# Altium footprint library General.PcbLib: 446 footprints (part 15 of 28)
Each footprint in its own frame and in the unit in brackets; x right, y up, seen from the top. Pads: shape width x height; smd on the part's side, far side on the other; paste and mask are expansions set on the pad; w line width, h text height; cw(c..) or ccw(c..) is an arc to the next point about the centre after c.
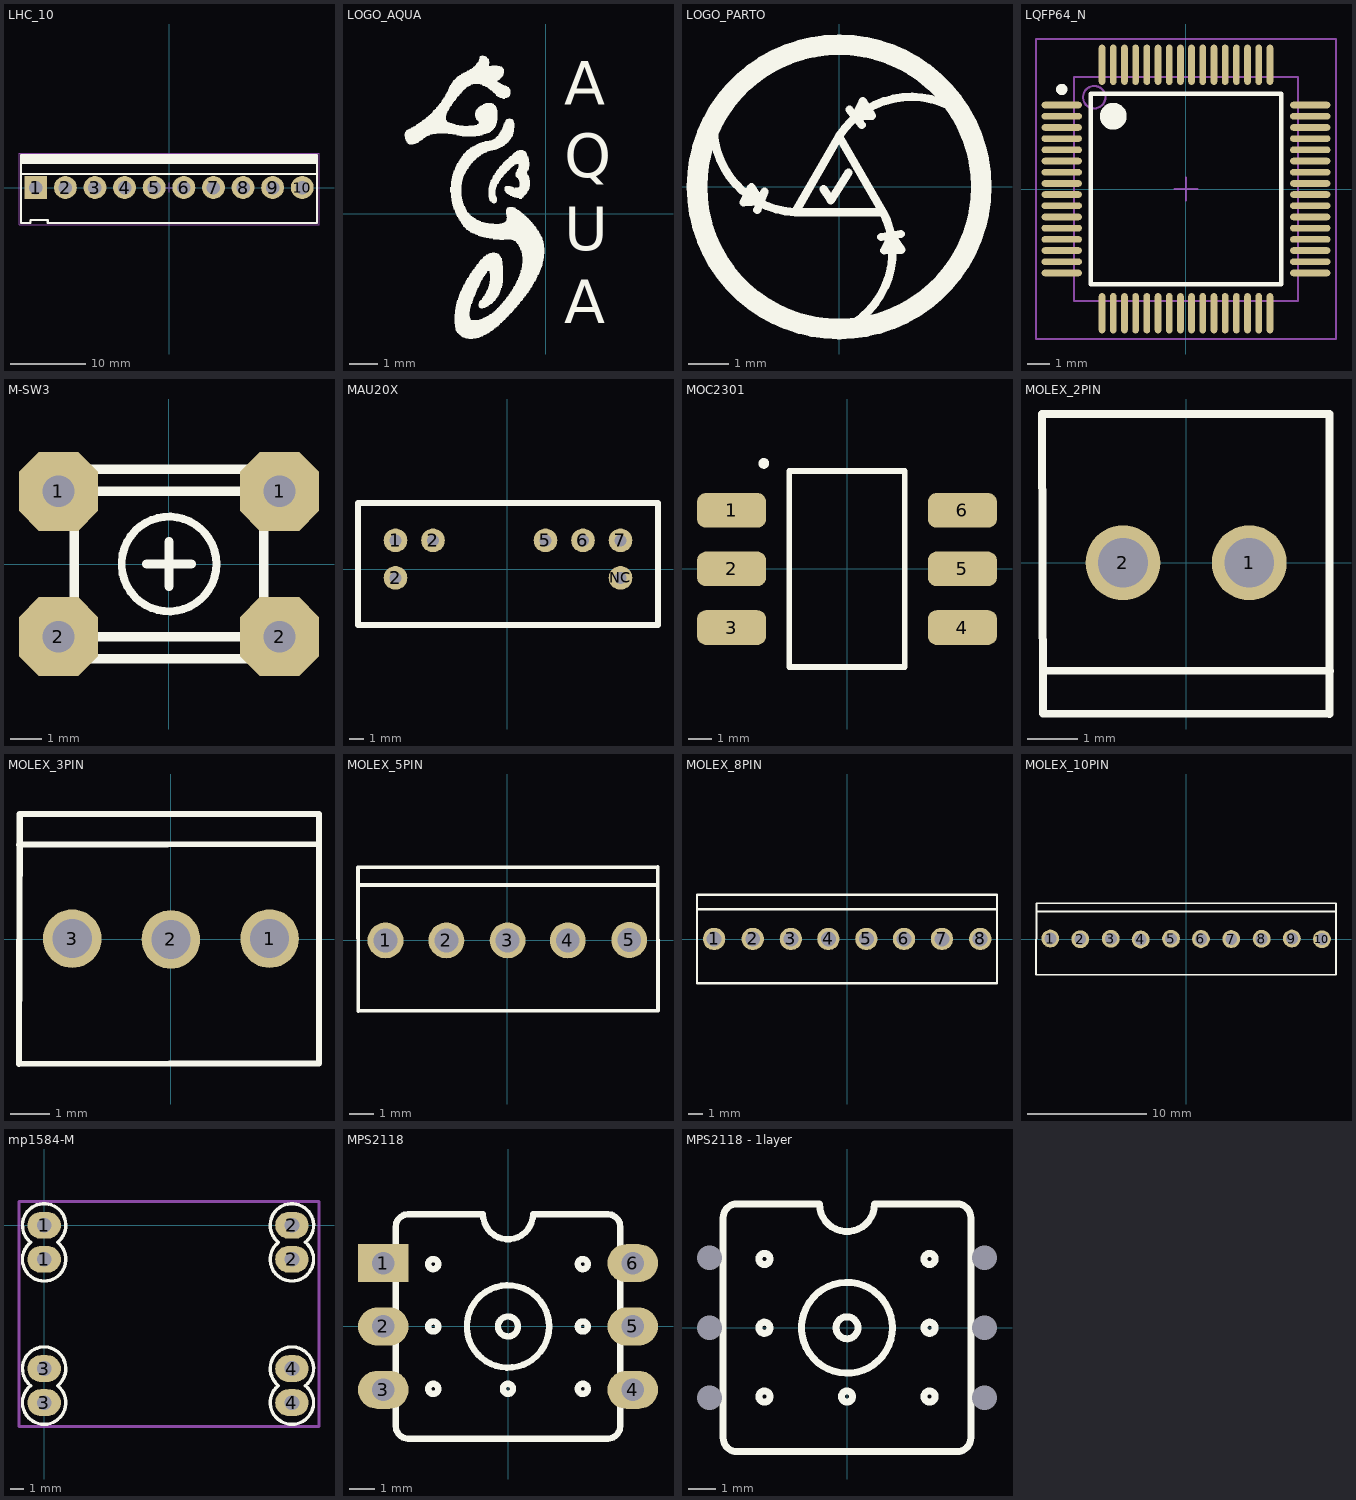
[diagram p14: the footprints below, top view; thin cyan lines are the x and y axes]

## LHC_10 [mil] "Connector; Power; 10 Position,3.96mm Pitch"
height 370.08
pads (10):
  rect 120x120 hole 70.87: 1(-697.5,0)
  round 120 hole 70.87: 2(-542.5,0) 3(-387.5,0) 4(-232.5,0) 5(-77.5,0) 6(77.5,0) 7(232.5,0) 8(387.5,0) 9(542.5,0) 10(697.5,0)
Top Overlay:
  rectangle: -775,129.92 775,169.29
  lines w12: -775,70.96 0,70.96 ; -775,71 775,71 ; 775,129.92 -775,129.92 ; -775,129.92 -775,-185.04 -725,-185.04 -725,-170 -635,-170 -635,-185.04 775,-185.04 775,169.29 -775,169.29 -775,129.92
Mechanical 13:
  lines w3.94: -775,70.96 0,70.96 ; -775,71 775,71 ; 775,129.92 -775,129.92 ; -775,129.92 -775,169.29 775,169.29 775,-185.04 -635,-185.04 -635,-170 -725,-170 -725,-185.04 -775,-185.04 -775,129.92 ; -725.06,-27.56 -669.94,-27.56 -669.94,27.56 -725.06,27.56 -725.06,-27.56 ; -570.06,-27.56 -570.06,27.56 -514.94,27.56 -514.94,-27.56 -570.06,-27.56 ; -415.06,-27.56 -359.94,-27.56 -359.94,27.56 -415.06,27.56 -415.06,-27.56 ; -260.06,-27.56 -260.06,27.56 -204.94,27.56 -204.94,-27.56 -260.06,-27.56 ; -105.06,-27.56 -49.94,-27.56 -49.94,27.56 -105.06,27.56 -105.06,-27.56 ; 49.94,-27.56 105.06,-27.56 105.06,27.56 49.94,27.56 49.94,-27.56 ; 204.94,-27.56 204.94,27.56 260.06,27.56 260.06,-27.56 204.94,-27.56 ; 359.94,-27.56 415.06,-27.56 415.06,27.56 359.94,27.56 359.94,-27.56 ; 514.94,-27.56 514.94,27.56 570.06,27.56 570.06,-27.56 514.94,-27.56 ; 669.94,-27.56 725.06,-27.56 725.06,27.56 669.94,27.56 669.94,-27.56
Mechanical 15:
  lines w3.94: -25,0 0,0 ; 0,-25 0,0 ; 0,25 0,0 ; 25,0 0,0 ; -785,-195 -785,180 785,180 785,-195 -785,-195
3D body: height 129.92, standoff 0, extent -774.98,-185.02 774.98,70.98
3D body: height 370.08, standoff 0, extent -774.98,71.02 774.98,129.9
3D body: height 370.08, standoff 330.71, extent -774.98,129.94 774.98,169.27
3D body: height 429.92, standoff -145.67, extent -725.04,-27.54 -669.96,27.54
3D body: height 429.92, standoff -145.67, extent -570.04,-27.54 -514.96,27.54
3D body: height 429.92, standoff -145.67, extent -415.04,-27.54 -359.96,27.54
3D body: height 429.92, standoff -145.67, extent -260.04,-27.54 -204.96,27.54
3D body: height 429.92, standoff -145.67, extent -105.04,-27.54 -49.96,27.54
3D body: height 429.92, standoff -145.67, extent 49.96,-27.54 105.04,27.54
3D body: height 429.92, standoff -145.67, extent 204.96,-27.54 260.04,27.54
3D body: height 429.92, standoff -145.67, extent 359.96,-27.54 415.04,27.54
3D body: height 429.92, standoff -145.67, extent 514.96,-27.54 570.04,27.54
3D body: height 429.92, standoff -145.67, extent 669.96,-27.54 725.04,27.54

## LOGO_AQUA [mm]
Top Overlay:
  drawing of 3 lines, arcs and shapes, not listed
  text "A" at 0.635,3.81 h1.52
  text "Q" at 0.635,1.27 h1.52
  text "U" at 0.635,-1.27 h1.52
  text "A" at 0.635,-3.81 h1.52

## LOGO_PARTO [mm]
Top Overlay:
  circle w0.508: c0,0 r3.5
  lines w0.203: -3.088,1.59 ccw(c-0.978,1.485) -1.083,-0.625 ; -2.013,-0.568 -1.836,-0.113 ; -0.387,-0.055 -0.203,-0.33 0.229,0.356 ; 0.167,-3.469 ccw(c-0.797,-1.59) 1.083,-0.625 ; 0.254,1.905 0.559,1.524 ; 1.038,-1.233 1.52,-1.16 ; 2.921,1.88 ccw(c1.775,0.104) 0,1.25 ; -1.083,-0.625 1.083,-0.625 ; -1.083,-0.625 0,1.25 ; 0,1.25 1.083,-0.625 ; -2.354,-0.383 -1.93,-0.356 -2.161,-0.008 -2.354,-0.383 ; 0.396,1.727 0.813,1.753 0.584,2.108 0.396,1.727 ; 1.109,-1.567 1.531,-1.547 1.295,-1.194 1.109,-1.567

## LQFP64_N [mm] "for stm32f103"
pads (64):
  oval 1.8x0.3 smd: 1(-5.55,3.75) 2(-5.55,3.25) 3(-5.55,2.75) 4(-5.55,2.25) 5(-5.55,1.75) 6(-5.55,1.25) 7(-5.55,0.75) 8(-5.55,0.25) 9(-5.55,-0.25) 10(-5.55,-0.75) 11(-5.55,-1.25) 12(-5.55,-1.75) 13(-5.55,-2.25) 14(-5.55,-2.75) 15(-5.55,-3.25) 16(-5.55,-3.75) 33(5.55,-3.75) 34(5.55,-3.25) 35(5.55,-2.75) 36(5.55,-2.25) 37(5.55,-1.75) 38(5.55,-1.25) 39(5.55,-0.75) 40(5.55,-0.25) 41(5.55,0.25) 42(5.55,0.75) 43(5.55,1.25) 44(5.55,1.75) 45(5.55,2.25) 46(5.55,2.75) 47(5.55,3.25) 48(5.55,3.75)
  oval 0.3x1.8 smd: 17(-3.75,-5.55) 18(-3.25,-5.55) 19(-2.75,-5.55) 20(-2.25,-5.55) 21(-1.75,-5.55) 22(-1.25,-5.55) 23(-0.75,-5.55) 24(-0.25,-5.55) 25(0.25,-5.55) 26(0.75,-5.55) 27(1.25,-5.55) 28(1.75,-5.55) 29(2.25,-5.55) 30(2.75,-5.55) 31(3.25,-5.55) 32(3.75,-5.55) 49(3.75,5.55) 50(3.25,5.55) 51(2.75,5.55) 52(2.25,5.55) 53(1.75,5.55) 54(1.25,5.55) 55(0.75,5.55) 56(0.25,5.55) 57(-0.25,5.55) 58(-0.75,5.55) 59(-1.25,5.55) 60(-1.75,5.55) 61(-2.25,5.55) 62(-2.75,5.55) 63(-3.25,5.55) 64(-3.75,5.55)
Top Overlay:
  circle w0.25: c-5.55,4.45 r0.125
  circle w0.6: c-3.25,3.25 r0.3
  lines w0.2: -4.25,-4.25 -4.25,4.25 4.25,4.25 4.25,-4.25 -4.25,-4.25
Mechanical 13:
  circle w0.1: c-4.1,4.1 r0.5
  lines w0.1: -5,-5 -5,5 5,5 5,-5 -5,-5
Mechanical 15:
  lines w0.1: -0.5,0 0.5,0 ; 0,-0.5 0,0.5 ; -6.7,-6.7 -6.7,6.7 6.7,6.7 6.7,-6.7 -6.7,-6.7
3D body "STM32F107 -LQFP64 10mm x 10mm.step": height 1.6, standoff 0.01, extent -6.003,-5.994 5.994,6.003

## M-SW3 [mm]
pads (4):
  oct 2.5x2.5 hole 1 unplated: 1(-3.5,2.3) 1(3.5,2.3) 2(-3.5,-2.3) 2(3.5,-2.3)
Top Overlay:
  circle w0.25: c0,0 r1.5
  lines w0.3: -3.525,-2.3 3.5,-2.3 ; -3.525,2.3 3.5,2.3 ; -0.7,0 0.7,0 ; 0,-0.7 0,0.7 ; -3,-3 3,-3 3,3 -3,3 -3,-3
3D body "User Library-KFC-A06-HA-4_3.STEP": height 4.3, standoff 0, extent -4.424,-2.946 4.576,3.054

## MAU20X [mm]
pads (7):
  round 1.6 hole 0.8: 1(-7.57,1.959) 2(-7.57,-0.581) 2(-5.03,1.959) 5(2.59,1.959) 6(5.13,1.959) 7(7.67,1.959) NC(7.67,-0.581)
Top Overlay:
  lines w0.4: -10.11,-3.781 10.21,-3.781 10.21,4.499 -10.11,4.499 -10.11,-3.781
3D body "User Library-TMV0505EN.STEP": height 10.2, standoff -3.2, extent -9.852,-3.659 9.648,3.891

## MAU20X/A0505D [mm]

## MOC2301 [mm]
pads (6):
  rrect50% 3x1.5 smd: 1(-5,2.54) 2(-5,0) 3(-5,-2.54) 4(5,-2.54) 5(5,0) 6(5,2.54)
Top Overlay:
  circle w0.254: c-3.607,4.572 r0.105
  lines w0.254: -2.501,-4.25 2.401,-4.25 ; -2.501,4.25 2.401,4.25 ; -2.5,-4.25 -2.5,4.25 ; 2.5,-4.25 2.5,4.25
3D body "moc3051.step": height 5.93, standoff 0, extent -4.925,-4.445 4.975,4.445

## MOLEX_2PIN [mm]
pads (2):
  round 1.5 hole 1: 1(1.265,0) 2(-1.265,0)
Top Overlay:
  lines w0.16: -2.86,-2.16 2.88,-2.17 ; -2.885,2.98 -2.865,-3.02 2.875,-3.03 2.875,2.98 -2.885,2.98
3D body "User Library-Molex 2 pines.STEP": height 3.2, standoff -11.5, extent -2.875,-3.02 2.875,2.98

## MOLEX_3PIN [mm]
pads (3):
  round 1.5 hole 1: 1(2.525,0.01) 2(0,-0.01) 3(-2.525,0.01)
Top Overlay:
  lines w0.16: -3.88,2.41 3.76,2.43 ; -3.887,-3.198 3.79,-3.178 3.79,3.2 -3.867,3.2 -3.887,-3.198
3D body "SW3dPS-Molex - 3-Pin Header with Lock (0.100in pitch).STEP": height 10.69, standoff -3.53, extent -3.835,-3.15 3.785,3.2

## MOLEX_5PIN [mm]
pads (5):
  round 1.5 hole 1: 1(-5.09,-0.01) 2(-2.55,-0.01) 3(0.01,-0.01) 4(2.52,-0.01) 5(5.09,0.01)
Top Overlay:
  lines w0.16: -6.159,2.31 6.27,2.31 ; -6.24,3.04 -6.23,-2.96 6.29,-2.95 6.28,3.06 -6.24,3.04
3D body "User Library-Molex 5 pines.STEP": height 11.5, standoff -3.2, extent -6.24,-2.95 6.28,3.05

## MOLEX_8PIN [mm]
pads (8):
  round 1.5 hole 1: 1(-8.94,0.025) 2(-6.34,0.025) 3(-3.78,0.025) 4(-1.26,0.025) 5(1.29,0.025) 6(3.82,0.025) 7(6.37,0.025) 8(8.94,0.025)
Top Overlay:
  lines w0.16: -10.09,2.03 10.07,2.03 ; -10.09,-2.96 -10.09,3 10.07,3 10.07,-2.96 -10.09,-2.96
3D body "User Library-Molex 8 pines.STEP": height 11.5, standoff -3.2, extent -10.04,-2.995 10.08,3.005

## MOLEX_10PIN [mm]
pads (10):
  round 1.5 hole 1: 1(-11.425,0.035) 2(-8.905,-0.015) 3(-6.335,0.025) 4(-3.825,-0.035) 5(-1.265,0.025) 6(1.245,0.005) 7(3.795,-0.005) 8(6.355,0.015) 9(8.895,0.035) 10(11.425,-0.015)
Top Overlay:
  lines w0.16: -12.55,2.3 12.59,2.3 ; -12.63,-3.01 -12.6,3.01 12.6,3 12.61,-3.01 -12.63,-3.01
3D body "User Library-Molex 10 pines.STEP": height 11.5, standoff -3.2, extent -12.615,-3.005 12.605,2.995

## mp1584-M [mm] "module"
pads (8):
  oval 2.5x2 hole 1.1: 1(0,-2.54) 1(0,0) 2(18.5,-2.54) 2(18.5,0) 3(0,-13.24) 3(0,-10.7) 4(18.5,-13.24) 4(18.5,-10.7)
Top Overlay:
  lines w0.254: -1.017,-11.982 ccw(c0,-13.24) 1.008,-11.974 ; -1.017,-1.282 ccw(c0,-2.54) 1.008,-1.274 ; -1.006,-11.967 cw(c0,-10.7) 1.004,-11.969 ; -1.006,-1.267 cw(c0,0) 1.004,-1.269 ; 17.483,-11.982 ccw(c18.5,-13.24) 19.508,-11.974 ; 17.483,-1.282 ccw(c18.5,-2.54) 19.508,-1.274 ; 17.494,-11.967 cw(c18.5,-10.7) 19.504,-11.969 ; 17.494,-1.267 cw(c18.5,0) 19.504,-1.269
Mechanical 15:
  lines w0.254: -1.877,-15.022 -1.877,1.778 20.523,1.778 20.523,-15.022 -1.877,-15.022

## MPS2118 [mm] "presser Sensor"
pads (6):
  rect 2.032x1.524 hole 0.9: 1(-5,2.54)
  oval 2.032x1.524 hole 0.9: 2(-5,0) 3(-5,-2.54) 4(5,-2.54) 5(5,0) 6(5,2.54)
Top Overlay:
  circle w0.254: c3,2.5 r0.202
  circle w0.254: c-3,2.5 r0.202
  circle w0.254: c-3,-2.5 r0.202
  circle w0.254: c-3,0 r0.202
  circle w0.254: c0,-2.5 r0.202
  circle w0.254: c3,-2.5 r0.202
  circle w0.254: c3,0 r0.202
  circle w0.254: c0,0 r0.4
  circle w0.254: c0,0 r1.65
  lines w0.254: -4.5,-4 ccw(c-4,-4) -4,-4.5 4,-4.5 ccw(c4,-4) 4.5,-4 4.5,4 ccw(c4,4) 4,4.5 1,4.5 cw(c0,4.5) -1,4.5 -4,4.5 ccw(c-4,4) -4.5,4 -4.5,-4
3D body: height 3.13, standoff 0.03, extent -4.5,-4.5 4.5,4.5
3D body: height 9.13, standoff 3.13, extent -1.65,-1.65 1.65,1.65

## MPS2118 - 1layer [mm] "presser Sensor"
pads (6):
  round 0 / inner oval 2.032x1.524 / far side rect 2.032x1.524 hole 0.9 unplated: 1(-5,2.54)
  round 0 / inner oval 2.032x1.524 / far side oval 2.032x1.524 hole 0.9 unplated: 2(-5,0) 3(-5,-2.54) 4(5,-2.54) 5(5,0) 6(5,2.54)
Top Overlay:
  circle w0.254: c0,0 r1.65
  circle w0.254: c0,0 r0.4
  circle w0.254: c3,0 r0.202
  circle w0.254: c3,-2.5 r0.202
  circle w0.254: c0,-2.5 r0.202
  circle w0.254: c-3,0 r0.202
  circle w0.254: c-3,-2.5 r0.202
  circle w0.254: c-3,2.5 r0.202
  circle w0.254: c3,2.5 r0.202
  lines w0.254: -4.5,-4 ccw(c-4,-4) -4,-4.5 4,-4.5 ccw(c4,-4) 4.5,-4 4.5,4 ccw(c4,4) 4,4.5 1,4.5 cw(c0,4.5) -1,4.5 -4,4.5 ccw(c-4,4) -4.5,4 -4.5,-4
3D body: height 9.13, standoff 3.13, extent -1.65,-1.65 1.65,1.65
3D body: height 3.13, standoff 0.03, extent -4.5,-4.5 4.5,4.5